# Altium footprint library 3.30-路由器网络变压器.PcbLib: 1 footprints
Each footprint in its own frame and in the unit in brackets; x right, y up, seen from the top. Pads: shape width x height; smd on the part's side, far side on the other; paste and mask are expansions set on the pad; w line width, h text height; cw(c..) or ccw(c..) is an arc to the next point about the centre after c.
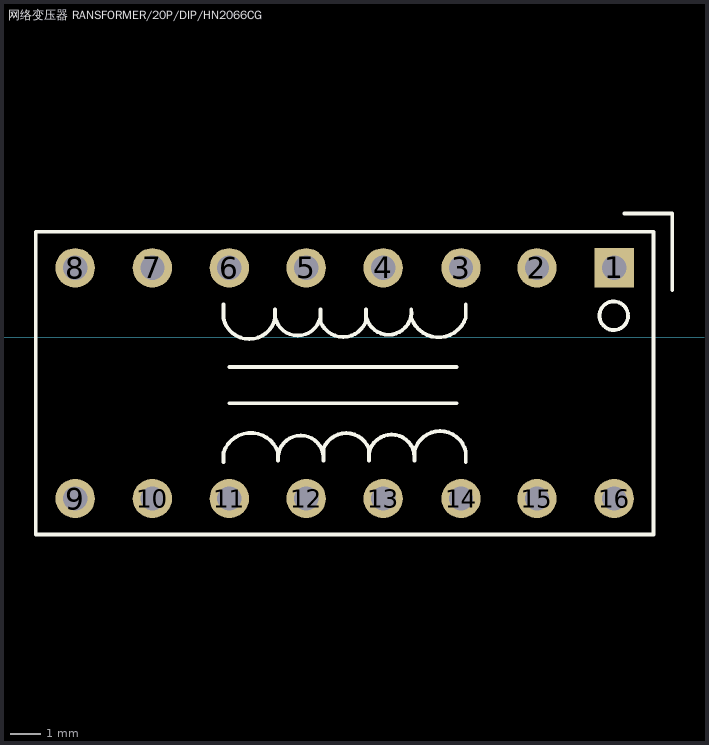
[diagram p0: the footprint, top view; thin cyan lines are the x and y axes]

## 网络变压器 RANSFORMER/20P/DIP/HN2066CG [mm] "[ PCBѧϰȺ514746572 ]"
pads (16):
  rect 1.3x1.3 / inner round 1.3 / far side round 1.3 hole 0.8: 1(-15.738,2.286)
  round 1.3 hole 0.8: 2(-18.288,2.286) 3(-20.795,2.286) 4(-23.368,2.286) 5(-25.908,2.286) 6(-28.448,2.286) 7(-30.988,2.286) 8(-33.538,2.286) 9(-33.538,-5.334) 10(-30.988,-5.334) 11(-28.448,-5.334) 12(-25.908,-5.334) 13(-23.368,-5.334) 14(-20.795,-5.334) 15(-18.288,-5.334) 16(-15.738,-5.334)
Top Overlay:
  circle w0.127: c-15.753,0.704 r0.473
  lines w0.127: -28.638,-4.127 -28.638,-3.813 cw(c-27.738,-4.114) -26.838,-3.813 -26.838,-4.088 cw(c-26.088,-4.005) -25.338,-4.087 -25.338,-3.688 cw(c-24.588,-3.978) -23.838,-3.687 ; -28.638,1.079 -28.638,0.612 ccw(c-27.788,0.802) -26.938,0.612 -26.938,0.913 ccw(c-26.188,0.803) -25.438,0.913 -25.438,0.513 ; -28.438,-2.187 -20.938,-2.187 ; -28.438,-0.988 -20.938,-0.988 ; -25.438,0.512 ccw(c-24.688,0.803) -23.938,0.513 -23.938,0.913 ccw(c-23.188,0.83) -22.438,0.912 -22.438,0.638 ; -23.838,-3.688 -23.838,-4.088 cw(c-23.088,-3.978) -22.338,-4.088 -22.338,-3.787 cw(c-21.488,-3.977) -20.638,-3.787 -20.638,-4.127 ; -22.438,0.637 ccw(c-21.538,0.938) -20.638,0.638 ; -20.638,0.638 -20.638,1.079 ; -15.393,4.082 -13.823,4.082 -13.823,1.552 ; -34.838,-6.524 -34.838,3.476 -14.438,3.476 -14.438,-6.524 -34.838,-6.524